# Altium footprint library My Library.PcbLib: 872 footprints (part 6 of 55)
Each footprint in its own frame and in the unit in brackets; x right, y up, seen from the top. Pads: shape width x height; smd on the part's side, far side on the other; paste and mask are expansions set on the pad; w line width, h text height; cw(c..) or ccw(c..) is an arc to the next point about the centre after c.
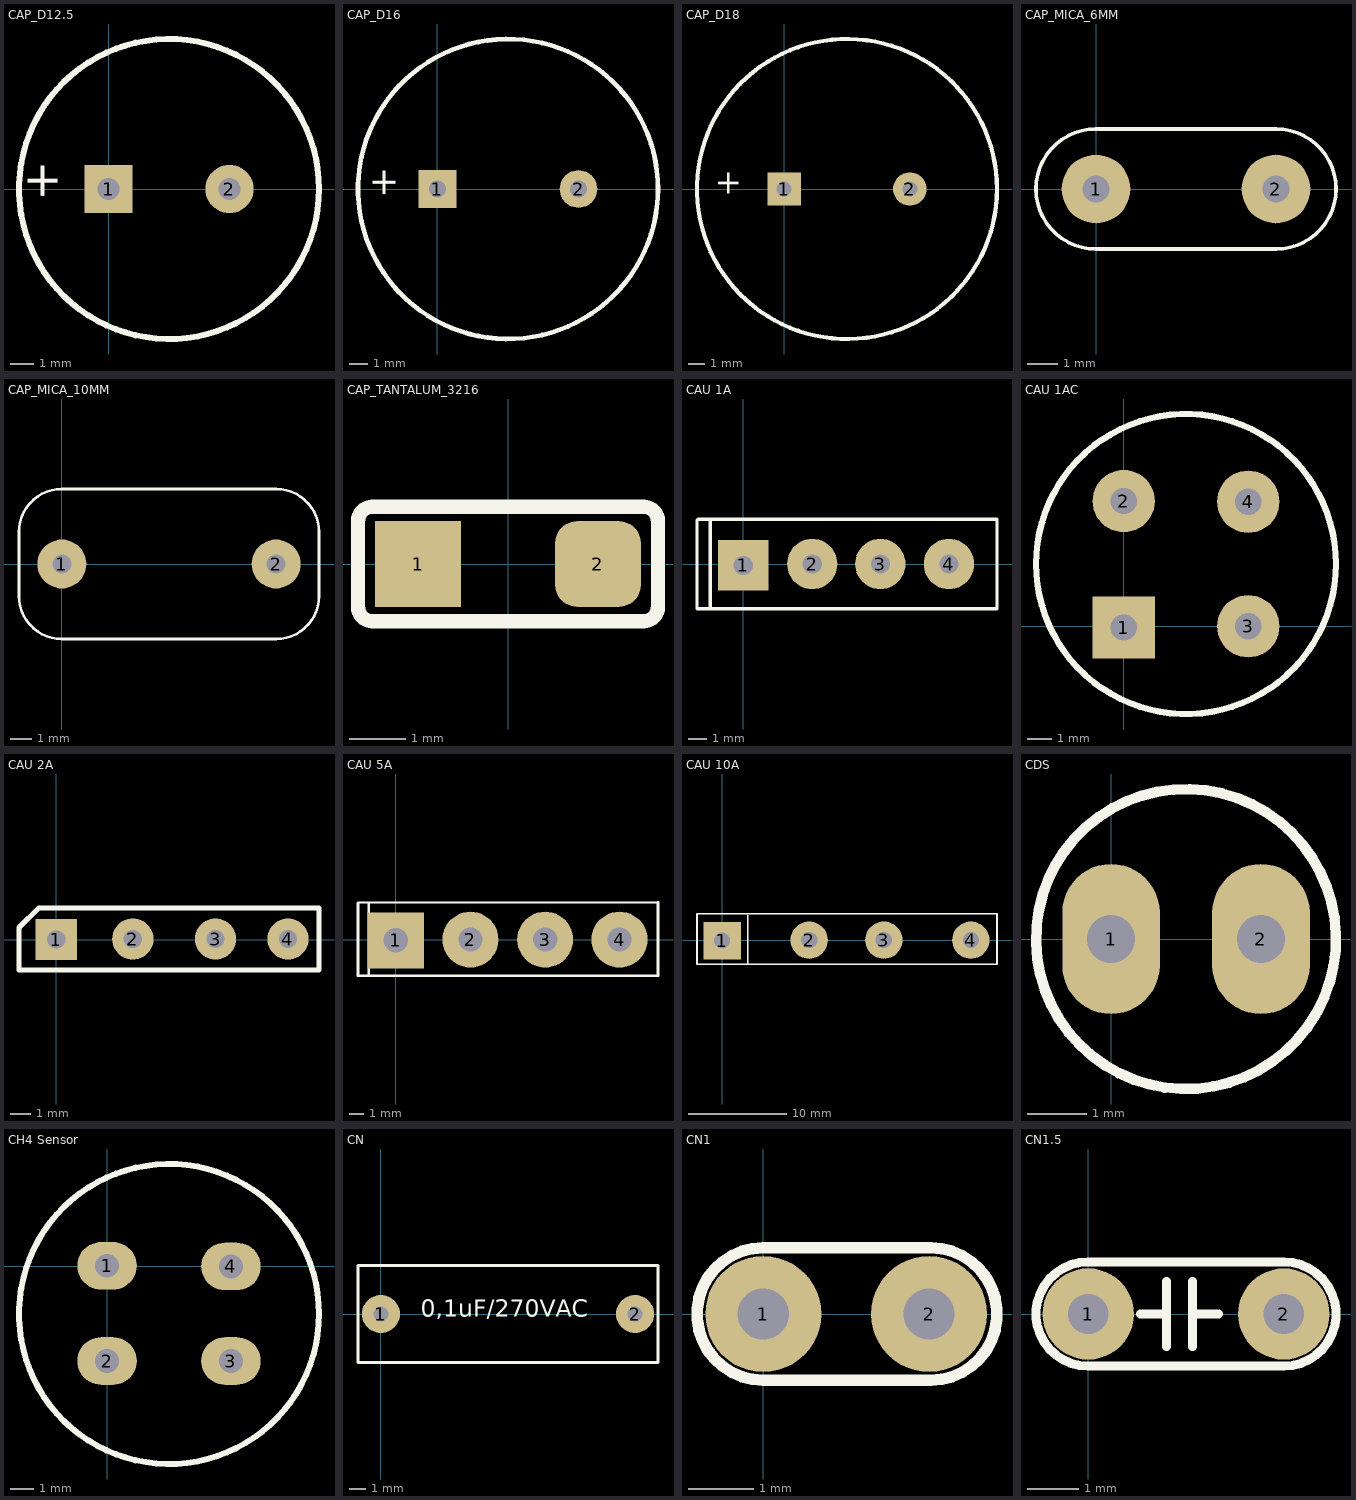
[diagram p5: the footprints below, top view; thin cyan lines are the x and y axes]

## CAP_D12.5 [mil]
pads (2):
  rect 80x80 hole 36: 1(0,0)
  round 80 hole 36: 2(200,0)
Top Overlay:
  circle w10: c100,0 r248.03
  text "+" at -65,-20 h100
3D body "User Library-CapAluRadial_D125H200.STEP": height 866.14, standoff -118.11, extent -155.9,-255.89 355.9,255.89

## CAP_D16 [mil]
pads (2):
  rect 80x80 hole 36: 1(0,0)
  round 80 hole 36: 2(300,0)
Top Overlay:
  circle w10: c150,0 r318.9
  text "+" at -70,-20 h100
3D body "User Library-CapAluRadial_D160H200.STEP": height 866.14, standoff -118.11, extent -174.8,-324.76 474.8,324.76

## CAP_D18 [mil]
pads (2):
  rect 80x80 hole 36: 1(0,0)
  round 80 hole 36: 2(300,0)
Top Overlay:
  circle w10: c150,0 r358.27
  text "+" at -90,-20 h100
3D body "User Library-CapAluRadial_D180H355.STEP": height 1476.38, standoff -118.11, extent -214.18,-364.16 514.17,364.15

## CAP_MICA_6MM [mil]
pads (2):
  round 90 hole 35: 1(0,0) 2(236.22,0)
Top Overlay:
  lines w4.72: 0,-78.74 cw(c0,0) 0,78.74 ; 236.22,-78.74 ccw(c236.22,0) 236.22,78.74
  lines w5: 0,-78.74 236.22,-78.74 ; 0,78.74 236.22,78.74
3D body "User Library-Film Capacitor 6x8mm.STEP": height 538.88, standoff -130.41, extent -38.37,-78.68 276.59,78.8

## CAP_MICA_10MM [mil]
pads (2):
  round 90 hole 35: 1(0,0) 2(393.7,0)
Top Overlay:
  lines w4.72: -78.74,-59.06 ccw(c0,-59.06) 0,-137.8 393.7,-137.8 ccw(c393.7,-59.06) 472.44,-59.06 ; -78.74,59.06 cw(c0,59.06) 0,137.8 393.7,137.8 cw(c393.7,59.06) 472.44,59.06
  lines w5: -78.74,-59.06 -78.74,59.06 ; 472.44,-59.06 472.44,59.06
3D body "User Library-Capacitor MKT_B32591C3104 (Pitch 10mm).STEP": height 570.87, standoff -157.48, extent -59.9,-99.85 451.9,97

## CAP_TANTALUM_3216 [mil]
pads (2):
  rect 60x60 smd: 1(-62.99,0)
  rrect50% 60x60 smd: 2(62.99,0)
Top Overlay:
  lines w10: -105,-30 ccw(c-95,-30) -95,-40 95,-40 ccw(c95,-30) 105,-30 105,30 ccw(c95,30) 95,40 -95,40 ccw(c-95,30) -105,30 -105,-30
3D body "User Library-CAP_TANT_3216-18_A_case-1.STEP": height 67.43, standoff 0.5, extent -66.92,-35.43 66.94,35.44

## CAU 1A [mil] "CAU 1A DET"
height 800
pads (4):
  rect 110x110 hole 42: 1(0,-2)
  round 110 hole 42: 2(151,1) 3(300,1) 4(450,1)
Top Overlay:
  lines w7: -72,-95 -72,99 ; -101,-97 555,-97 555,99 -99,99 -101,97 -101,-97
3D body "SW3dPS-KBPM.STEP": height 453.36, standoff -499.4, extent -61.99,-90 511.99,107.24

## CAU 1AC [mil] "CAU 1A TRON"
height 800
pads (4):
  rect 100x100 hole 42: 1(0,-2)
  round 100 hole 42: 2(0,201) 3(200,0) 4(200,200)
Top Overlay:
  circle w10: c100,100 r240.88

## CAU 2A [mil]
pads (4):
  rect 80x80 hole 35: 1(0,0)
  round 80 hole 35: 2(148,1) 3(308,1) 4(448,1)
Top Overlay:
  lines w10: -72,-59 -72,23 -34,61 448,61 508,61 508,-59 -72,-59

## CAU 5A [mil] "CAU 5A DET"
height 800
pads (4):
  rect 150x150 hole 65: 1(0,-2)
  round 150 hole 65: 2(200,0) 3(400,0) 4(599,0)
Top Overlay:
  lines w7: -72,-95 -72,99 ; -101,-97 -101,97 -99,99 702,100 702,-97 -101,-97
3D body "SW3dPS-bridge 2.STEP": height 820.68, standoff -621.62, extent -138.98,-105 738.98,43.03

## CAU 10A [mil] "CAU 10A det"
height 800
pads (4):
  rect 150x150 hole 65: 1(0,-2)
  round 150 hole 65: 2(350,0) 3(650,0) 4(1000,0)
Top Overlay:
  lines w7: 103,-95 103,99 ; -101,-97 1105,-97 1105,106.36 -101,104.86 -101,-97

## CDS [mil] "QUANG TRO"
height 300
pads (2):
  oval 65x100 hole 32: 1(0,0) 2(100,0)
Top Overlay:
  lines w7: 136.62,-49.97 cw(c50,0) 137.42,-48.56

## CH4 Sensor [mm]
pads (4):
  oval 2.5x2 hole 1: 1(0,0.025) 2(0,-3.975) 3(5.2,-3.975) 4(5.2,0)
Top Overlay:
  circle w0.254: c2.6,-2 r6.3

## CN [mil] "Tu loc 220"
height 100
pads (2):
  round 90 hole 35: 1(0,0) 2(600,0)
Top Overlay:
  lines w7: -54,-115 -54,115 654,115 654,-115 -54,-115
  text "0,1uF/270VAC" at 94,-21 h70

## CN1 [mil]
height 200
pads (2):
  round 70 hole 31: 1(0,0) 2(100,0)
Top Overlay:
  lines w7: 100,-40 0,-40 cw(c0,0) 0,40 100,40 ; 101,-40 ccw(c101,0) 101,40
3D body "SW3dPS-Cap 100n.STEP": height 265, standoff -46.85, extent -59.93,-30 169.93,36.79

## CN1.5 [mil]
height 200
pads (2):
  round 70 hole 31: 1(0,0) 2(150,0)
Top Overlay:
  lines w7: 40,0 60,0 ; 60,-25 60,25 ; 80,-25 80,25 ; 80,0 100,0 ; 0,-40 cw(c0,0) 0,40 150,40 cw(c150,0) 150,-40 0,-40
3D body "cn104.STEP": height 235, standoff -76.85, extent -39.86,-33.39 190,33.4